# Altium footprint library 排针-排母-1.27.PcbLib: 152 footprints (part 6 of 10)
Each footprint in its own frame and in the unit in brackets; x right, y up, seen from the top. Pads: shape width x height; smd on the part's side, far side on the other; paste and mask are expansions set on the pad; w line width, h text height; cw(c..) or ccw(c..) is an arc to the next point about the centre after c.
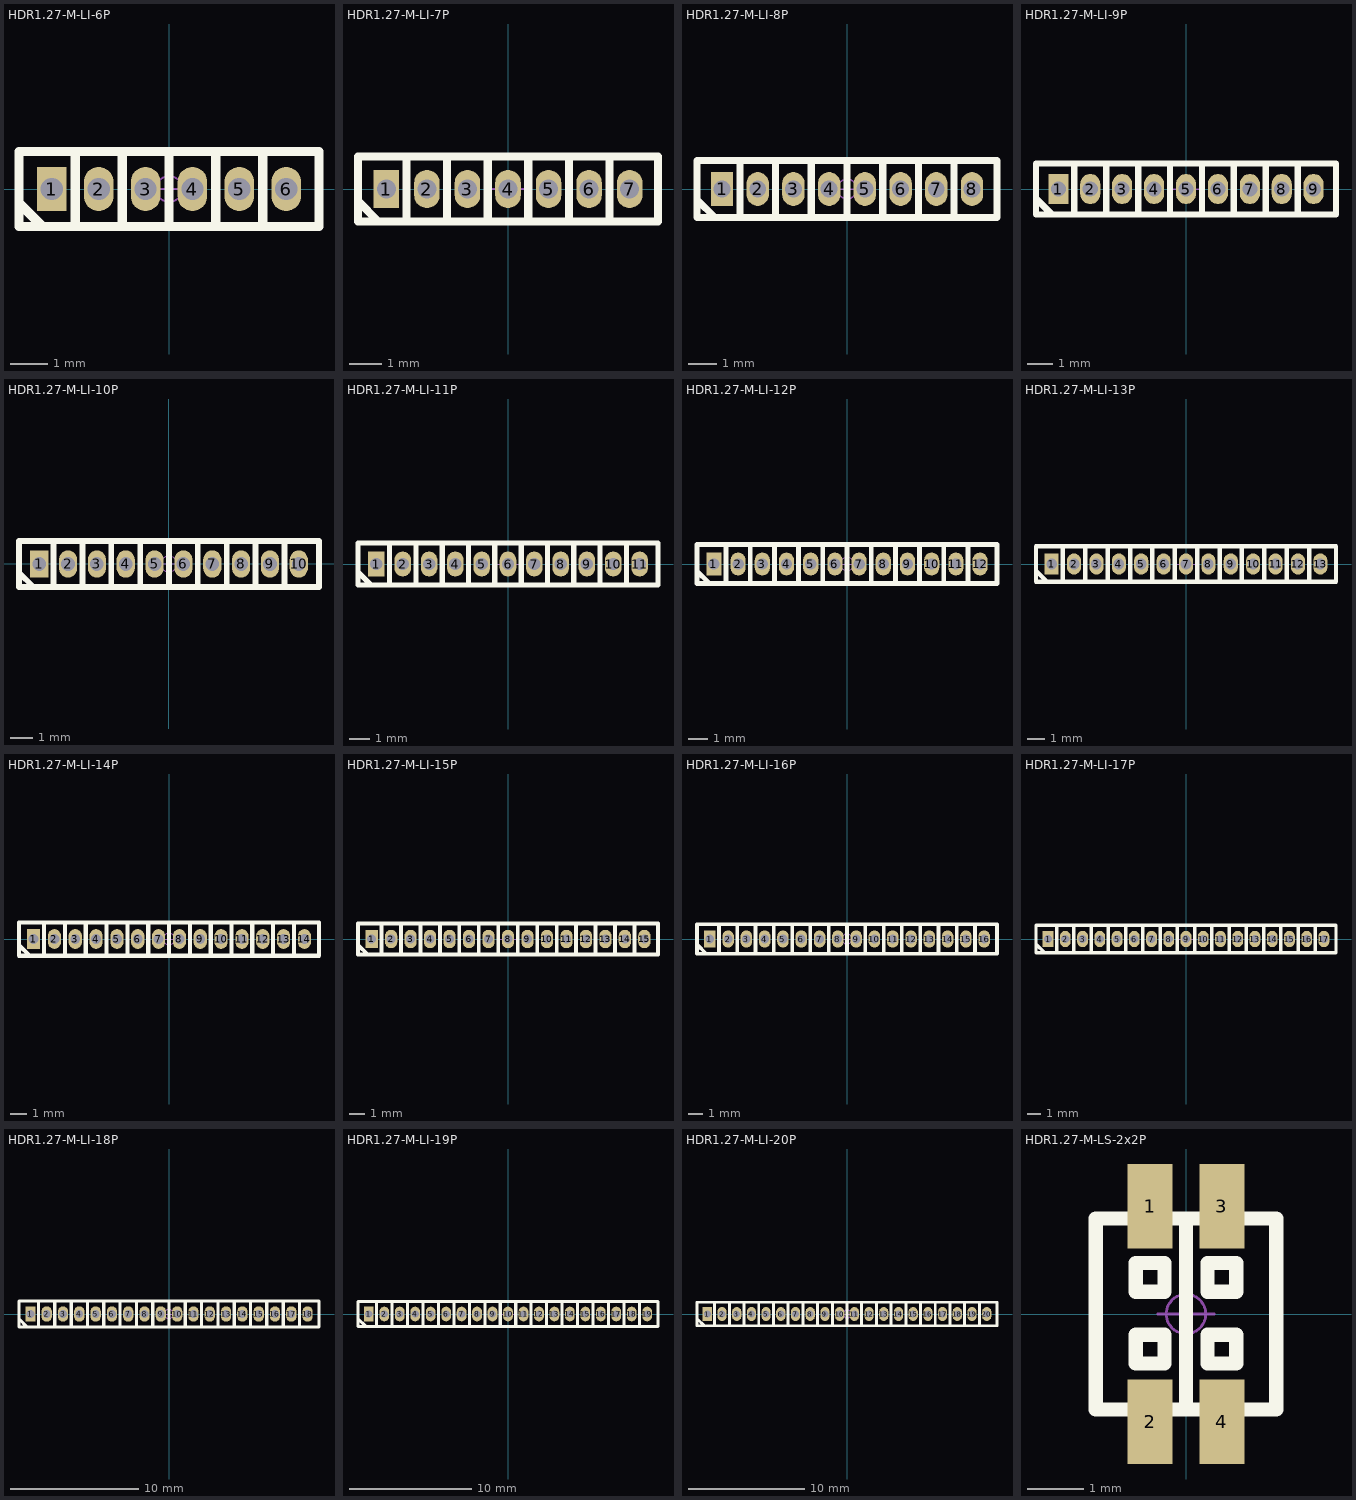
[diagram p5: the footprints below, top view; thin cyan lines are the x and y axes]

## HDR1.27-M-LI-6P [mm] "直插，脚距：1.27mm"
pads (6):
  rect 0.8x1.2 hole 0.6: 1(-3.175,0)
  oval 0.8x1.2 hole 0.6: 2(-1.905,0) 3(-0.635,0) 4(0.635,0) 5(1.905,0) 6(3.175,0)
Top Overlay:
  lines w0.254: -4.064,-0.254 -4.064,-0.381 -3.429,-1.016 ; -2.54,-1.016 -2.54,1.016 ; -1.27,-1.016 -1.27,1.016 ; 0,-1.016 0,1.016 ; 1.27,-1.016 1.27,1.016 ; 2.54,-1.016 2.54,1.016 ; -4.064,-1.016 4.064,-1.016 4.064,1.016 -4.064,1.016 -4.064,-1.016
Mechanical 15:
  circle w0.05: c0,0 r0.35
  lines w0.05: -0.5,0 0.5,0 ; 0,-0.5 0,0.5
3D body: height 4.5, standoff -2.1, extent -3.975,-0.9 3.975,0.9

## HDR1.27-M-LI-7P [mm] "直插，脚距：1.27mm"
pads (7):
  rect 0.8x1.2 hole 0.6: 1(-3.81,0)
  oval 0.8x1.2 hole 0.6: 2(-2.54,0) 3(-1.27,0) 4(0,0) 5(1.27,0) 6(2.54,0) 7(3.81,0)
Top Overlay:
  lines w0.254: -4.699,-0.254 -4.699,-0.381 -4.064,-1.016 ; -3.175,-1.016 -3.175,1.016 ; -1.905,-1.016 -1.905,1.016 ; -0.635,-1.016 -0.635,1.016 ; 0.635,-1.016 0.635,1.016 ; 1.905,-1.016 1.905,1.016 ; 3.175,-1.016 3.175,1.016 ; -4.699,-1.016 4.699,-1.016 4.699,1.016 -4.699,1.016 -4.699,-1.016
Mechanical 15:
  circle w0.05: c0,0 r0.35
  lines w0.05: -0.5,0 0.5,0 ; 0,-0.5 0,0.5
3D body: height 4.5, standoff -2.1, extent -4.61,-0.9 4.61,0.9

## HDR1.27-M-LI-8P [mm] "直插，脚距：1.27mm"
pads (8):
  rect 0.8x1.2 hole 0.6: 1(-4.445,0)
  oval 0.8x1.2 hole 0.6: 2(-3.175,0) 3(-1.905,0) 4(-0.635,0) 5(0.635,0) 6(1.905,0) 7(3.175,0) 8(4.445,0)
Top Overlay:
  lines w0.254: -5.334,-0.254 -5.334,-0.381 -4.699,-1.016 ; -3.81,-1.016 -3.81,1.016 ; -2.54,-1.016 -2.54,1.016 ; -1.27,-1.016 -1.27,1.016 ; 0,-1.016 0,1.016 ; 1.27,-1.016 1.27,1.016 ; 2.54,-1.016 2.54,1.016 ; 3.81,-1.016 3.81,1.016 ; -5.334,-1.016 -5.334,1.016 5.334,1.016 5.334,-1.016 -5.334,-1.016
Mechanical 15:
  circle w0.05: c0,0 r0.35
  lines w0.05: -0.5,0 0.5,0 ; 0,-0.5 0,0.5
3D body: height 4.5, standoff -2.1, extent -5.245,-0.9 5.245,0.9

## HDR1.27-M-LI-9P [mm] "直插，脚距：1.27mm"
pads (9):
  rect 0.8x1.2 hole 0.6: 1(-5.08,0)
  oval 0.8x1.2 hole 0.6: 2(-3.81,0) 3(-2.54,0) 4(-1.27,0) 5(0,0) 6(1.27,0) 7(2.54,0) 8(3.81,0) 9(5.08,0)
Top Overlay:
  lines w0.254: -5.969,-0.254 -5.969,-0.381 -5.334,-1.016 ; -4.445,-1.016 -4.445,1.016 ; -3.175,-1.016 -3.175,1.016 ; -1.905,-1.016 -1.905,1.016 ; -0.635,-1.016 -0.635,1.016 ; 0.635,-1.016 0.635,1.016 ; 1.905,-1.016 1.905,1.016 ; 3.175,-1.016 3.175,1.016 ; 4.445,-1.016 4.445,1.016 ; -5.969,-1.016 5.969,-1.016 5.969,1.016 -5.969,1.016 -5.969,-1.016
Mechanical 15:
  circle w0.05: c0,0 r0.35
  lines w0.05: -0.5,0 0.5,0 ; 0,-0.5 0,0.5
3D body: height 4.5, standoff -2.1, extent -5.88,-0.9 5.88,0.9

## HDR1.27-M-LI-10P [mm] "直插，脚距：1.27mm"
pads (10):
  rect 0.8x1.2 hole 0.6: 1(-5.715,0)
  oval 0.8x1.2 hole 0.6: 2(-4.445,0) 3(-3.175,0) 4(-1.905,0) 5(-0.635,0) 6(0.635,0) 7(1.905,0) 8(3.175,0) 9(4.445,0) 10(5.715,0)
Top Overlay:
  lines w0.254: -6.604,-0.254 -6.604,-0.381 -5.969,-1.016 ; -5.08,-1.016 -5.08,1.016 ; -3.81,-1.016 -3.81,1.016 ; -2.54,-1.016 -2.54,1.016 ; -1.27,-1.016 -1.27,1.016 ; 0,-1.016 0,1.016 ; 1.27,-1.016 1.27,1.016 ; 2.54,-1.016 2.54,1.016 ; 3.81,-1.016 3.81,1.016 ; 5.08,-1.016 5.08,1.016 ; -6.604,-1.016 -6.604,1.016 6.604,1.016 6.604,-1.016 -6.604,-1.016
Mechanical 15:
  circle w0.05: c0,0 r0.35
  lines w0.05: -0.5,0 0.5,0 ; 0,-0.5 0,0.5
3D body: height 4.5, standoff -2.1, extent -6.515,-0.9 6.515,0.9

## HDR1.27-M-LI-11P [mm] "直插，脚距：1.27mm"
pads (11):
  rect 0.8x1.2 hole 0.6: 1(-6.35,0)
  oval 0.8x1.2 hole 0.6: 2(-5.08,0) 3(-3.81,0) 4(-2.54,0) 5(-1.27,0) 6(0,0) 7(1.27,0) 8(2.54,0) 9(3.81,0) 10(5.08,0) 11(6.35,0)
Top Overlay:
  lines w0.254: -7.239,-0.254 -7.239,-0.381 -6.604,-1.016 ; -5.715,-1.016 -5.715,1.016 ; -4.445,-1.016 -4.445,1.016 ; -3.175,-1.016 -3.175,1.016 ; -1.905,-1.016 -1.905,1.016 ; -0.635,-1.016 -0.635,1.016 ; 0.635,-1.016 0.635,1.016 ; 1.905,-1.016 1.905,1.016 ; 3.175,-1.016 3.175,1.016 ; 4.445,-1.016 4.445,1.016 ; 5.715,-1.016 5.715,1.016 ; -7.239,-1.016 7.239,-1.016 7.239,1.016 -7.239,1.016 -7.239,-1.016
Mechanical 15:
  circle w0.05: c0,0 r0.35
  lines w0.05: -0.5,0 0.5,0 ; 0,-0.5 0,0.5
3D body: height 4.5, standoff -2.1, extent -7.15,-0.9 7.15,0.9

## HDR1.27-M-LI-12P [mm] "直插，脚距：1.27mm"
pads (12):
  rect 0.8x1.2 hole 0.6: 1(-6.985,0)
  oval 0.8x1.2 hole 0.6: 2(-5.715,0) 3(-4.445,0) 4(-3.175,0) 5(-1.905,0) 6(-0.635,0) 7(0.635,0) 8(1.905,0) 9(3.175,0) 10(4.445,0) 11(5.715,0) 12(6.985,0)
Top Overlay:
  lines w0.254: -7.874,-0.254 -7.874,-0.381 -7.239,-1.016 ; -6.35,-1.016 -6.35,1.016 ; -5.08,-1.016 -5.08,1.016 ; -3.81,-1.016 -3.81,1.016 ; -2.54,-1.016 -2.54,1.016 ; -1.27,-1.016 -1.27,1.016 ; 0,-1.016 0,1.016 ; 1.27,-1.016 1.27,1.016 ; 2.54,-1.016 2.54,1.016 ; 3.81,-1.016 3.81,1.016 ; 5.08,-1.016 5.08,1.016 ; 6.35,-1.016 6.35,1.016 ; -7.874,-1.016 7.874,-1.016 7.874,1.016 -7.874,1.016 -7.874,-1.016
Mechanical 15:
  circle w0.05: c0,0 r0.35
  lines w0.05: -0.5,0 0.5,0 ; 0,-0.5 0,0.5
3D body: height 4.5, standoff -2.1, extent -7.785,-0.9 7.785,0.9

## HDR1.27-M-LI-13P [mm] "直插，脚距：1.27mm"
pads (13):
  rect 0.8x1.2 hole 0.6: 1(-7.62,0)
  oval 0.8x1.2 hole 0.6: 2(-6.35,0) 3(-5.08,0) 4(-3.81,0) 5(-2.54,0) 6(-1.27,0) 7(0,0) 8(1.27,0) 9(2.54,0) 10(3.81,0) 11(5.08,0) 12(6.35,0) 13(7.62,0)
Top Overlay:
  lines w0.254: -8.509,-0.254 -8.509,-0.381 -7.874,-1.016 ; -6.985,-1.016 -6.985,1.016 ; -5.715,-1.016 -5.715,1.016 ; -4.445,-1.016 -4.445,1.016 ; -3.175,-1.016 -3.175,1.016 ; -1.905,-1.016 -1.905,1.016 ; -0.635,-1.016 -0.635,1.016 ; 0.635,-1.016 0.635,1.016 ; 1.905,-1.016 1.905,1.016 ; 3.175,-1.016 3.175,1.016 ; 4.445,-1.016 4.445,1.016 ; 5.715,-1.016 5.715,1.016 ; 6.985,-1.016 6.985,1.016 ; -8.509,-1.016 8.509,-1.016 8.509,1.016 -8.509,1.016 -8.509,-1.016
Mechanical 15:
  circle w0.05: c0,0 r0.35
  lines w0.05: -0.5,0 0.5,0 ; 0,-0.5 0,0.5
3D body: height 4.5, standoff -2.1, extent -8.42,-0.9 8.42,0.9

## HDR1.27-M-LI-14P [mm] "直插，脚距：1.27mm"
pads (14):
  rect 0.8x1.2 hole 0.6: 1(-8.255,0)
  oval 0.8x1.2 hole 0.6: 2(-6.985,0) 3(-5.715,0) 4(-4.445,0) 5(-3.175,0) 6(-1.905,0) 7(-0.635,0) 8(0.635,0) 9(1.905,0) 10(3.175,0) 11(4.445,0) 12(5.715,0) 13(6.985,0) 14(8.255,0)
Top Overlay:
  lines w0.254: -9.144,-0.254 -9.144,-0.381 -8.509,-1.016 ; -7.62,-1.016 -7.62,1.016 ; -6.35,-1.016 -6.35,1.016 ; -5.08,-1.016 -5.08,1.016 ; -3.81,-1.016 -3.81,1.016 ; -2.54,-1.016 -2.54,1.016 ; -1.27,-1.016 -1.27,1.016 ; 0,-1.016 0,1.016 ; 1.27,-1.016 1.27,1.016 ; 2.54,-1.016 2.54,1.016 ; 3.81,-1.016 3.81,1.016 ; 5.08,-1.016 5.08,1.016 ; 6.35,-1.016 6.35,1.016 ; 7.62,-1.016 7.62,1.016 ; -9.144,-1.016 -9.144,1.016 9.144,1.016 9.144,-1.016 -9.144,-1.016
Mechanical 15:
  circle w0.05: c0,0 r0.35
  lines w0.05: -0.5,0 0.5,0 ; 0,-0.5 0,0.5
3D body: height 4.5, standoff -2.1, extent -9.055,-0.9 9.055,0.9

## HDR1.27-M-LI-15P [mm] "直插，脚距：1.27mm"
pads (15):
  rect 0.8x1.2 hole 0.6: 1(-8.89,0)
  oval 0.8x1.2 hole 0.6: 2(-7.62,0) 3(-6.35,0) 4(-5.08,0) 5(-3.81,0) 6(-2.54,0) 7(-1.27,0) 8(0,0) 9(1.27,0) 10(2.54,0) 11(3.81,0) 12(5.08,0) 13(6.35,0) 14(7.62,0) 15(8.89,0)
Top Overlay:
  lines w0.254: -9.779,-0.254 -9.779,-0.381 -9.144,-1.016 ; -8.255,-1.016 -8.255,1.016 ; -6.985,-1.016 -6.985,1.016 ; -5.715,-1.016 -5.715,1.016 ; -4.445,-1.016 -4.445,1.016 ; -3.175,-1.016 -3.175,1.016 ; -1.905,-1.016 -1.905,1.016 ; -0.635,-1.016 -0.635,1.016 ; 0.635,-1.016 0.635,1.016 ; 1.905,-1.016 1.905,1.016 ; 3.175,-1.016 3.175,1.016 ; 4.445,-1.016 4.445,1.016 ; 5.715,-1.016 5.715,1.016 ; 6.985,-1.016 6.985,1.016 ; 8.255,-1.016 8.255,1.016 ; -9.779,-1.016 -9.779,1.016 9.779,1.016 9.779,-1.016 -9.779,-1.016
Mechanical 15:
  circle w0.05: c0,0 r0.35
  lines w0.05: -0.5,0 0.5,0 ; 0,-0.5 0,0.5
3D body: height 4.5, standoff -2.1, extent -9.69,-0.9 9.69,0.9

## HDR1.27-M-LI-16P [mm] "直插，脚距：1.27mm"
pads (16):
  rect 0.8x1.2 hole 0.6: 1(-9.525,0)
  oval 0.8x1.2 hole 0.6: 2(-8.255,0) 3(-6.985,0) 4(-5.715,0) 5(-4.445,0) 6(-3.175,0) 7(-1.905,0) 8(-0.635,0) 9(0.635,0) 10(1.905,0) 11(3.175,0) 12(4.445,0) 13(5.715,0) 14(6.985,0) 15(8.255,0) 16(9.525,0)
Top Overlay:
  lines w0.254: -10.414,-0.254 -10.414,-0.381 -9.779,-1.016 ; -8.89,-1.016 -8.89,1.016 ; -7.62,-1.016 -7.62,1.016 ; -6.35,-1.016 -6.35,1.016 ; -5.08,-1.016 -5.08,1.016 ; -3.81,-1.016 -3.81,1.016 ; -2.54,-1.016 -2.54,1.016 ; -1.27,-1.016 -1.27,1.016 ; 0,-1.016 0,1.016 ; 1.27,-1.016 1.27,1.016 ; 2.54,-1.016 2.54,1.016 ; 3.81,-1.016 3.81,1.016 ; 5.08,-1.016 5.08,1.016 ; 6.35,-1.016 6.35,1.016 ; 7.62,-1.016 7.62,1.016 ; 8.89,-1.016 8.89,1.016 ; -10.414,-1.016 -10.414,1.016 10.414,1.016 10.414,-1.016 -10.414,-1.016
Mechanical 15:
  circle w0.05: c0,0 r0.35
  lines w0.05: -0.5,0 0.5,0 ; 0,-0.5 0,0.5
3D body: height 4.5, standoff -2.1, extent -10.325,-0.9 10.325,0.9

## HDR1.27-M-LI-17P [mm] "直插，脚距：1.27mm"
pads (17):
  rect 0.8x1.2 hole 0.6: 1(-10.16,0)
  oval 0.8x1.2 hole 0.6: 2(-8.89,0) 3(-7.62,0) 4(-6.35,0) 5(-5.08,0) 6(-3.81,0) 7(-2.54,0) 8(-1.27,0) 9(0,0) 10(1.27,0) 11(2.54,0) 12(3.81,0) 13(5.08,0) 14(6.35,0) 15(7.62,0) 16(8.89,0) 17(10.16,0)
Top Overlay:
  lines w0.254: -11.049,-0.254 -11.049,-0.381 -10.414,-1.016 ; -9.525,-1.016 -9.525,1.016 ; -8.255,-1.016 -8.255,1.016 ; -6.985,-1.016 -6.985,1.016 ; -5.715,-1.016 -5.715,1.016 ; -4.445,-1.016 -4.445,1.016 ; -3.175,-1.016 -3.175,1.016 ; -1.905,-1.016 -1.905,1.016 ; -0.635,-1.016 -0.635,1.016 ; 0.635,-1.016 0.635,1.016 ; 1.905,-1.016 1.905,1.016 ; 3.175,-1.016 3.175,1.016 ; 4.445,-1.016 4.445,1.016 ; 5.715,-1.016 5.715,1.016 ; 6.985,-1.016 6.985,1.016 ; 8.255,-1.016 8.255,1.016 ; 9.525,-1.016 9.525,1.016 ; -11.049,-1.016 11.049,-1.016 11.049,1.016 -11.049,1.016 -11.049,-1.016
Mechanical 15:
  circle w0.05: c0,0 r0.35
  lines w0.05: -0.5,0 0.5,0 ; 0,-0.5 0,0.5
3D body: height 4.5, standoff -2.1, extent -10.96,-0.9 10.96,0.9

## HDR1.27-M-LI-18P [mm] "直插，脚距：1.27mm"
pads (18):
  rect 0.8x1.2 hole 0.6: 1(-10.795,0)
  oval 0.8x1.2 hole 0.6: 2(-9.525,0) 3(-8.255,0) 4(-6.985,0) 5(-5.715,0) 6(-4.445,0) 7(-3.175,0) 8(-1.905,0) 9(-0.635,0) 10(0.635,0) 11(1.905,0) 12(3.175,0) 13(4.445,0) 14(5.715,0) 15(6.985,0) 16(8.255,0) 17(9.525,0) 18(10.795,0)
Top Overlay:
  lines w0.254: -11.684,-0.254 -11.684,-0.381 -11.049,-1.016 ; -10.16,-1.016 -10.16,1.016 ; -8.89,-1.016 -8.89,1.016 ; -7.62,-1.016 -7.62,1.016 ; -6.35,-1.016 -6.35,1.016 ; -5.08,-1.016 -5.08,1.016 ; -3.81,-1.016 -3.81,1.016 ; -2.54,-1.016 -2.54,1.016 ; -1.27,-1.016 -1.27,1.016 ; 0,-1.016 0,1.016 ; 1.27,-1.016 1.27,1.016 ; 2.54,-1.016 2.54,1.016 ; 3.81,-1.016 3.81,1.016 ; 5.08,-1.016 5.08,1.016 ; 6.35,-1.016 6.35,1.016 ; 7.62,-1.016 7.62,1.016 ; 8.89,-1.016 8.89,1.016 ; 10.16,-1.016 10.16,1.016 ; -11.684,-1.016 -11.684,1.016 11.684,1.016 11.684,-1.016 -11.684,-1.016
Mechanical 15:
  circle w0.05: c0,0 r0.35
  lines w0.05: -0.5,0 0.5,0 ; 0,-0.5 0,0.5
3D body: height 4.5, standoff -2.1, extent -11.595,-0.9 11.595,0.9

## HDR1.27-M-LI-19P [mm] "直插，脚距：1.27mm"
pads (19):
  rect 0.8x1.2 hole 0.6: 1(-11.43,0)
  oval 0.8x1.2 hole 0.6: 2(-10.16,0) 3(-8.89,0) 4(-7.62,0) 5(-6.35,0) 6(-5.08,0) 7(-3.81,0) 8(-2.54,0) 9(-1.27,0) 10(0,0) 11(1.27,0) 12(2.54,0) 13(3.81,0) 14(5.08,0) 15(6.35,0) 16(7.62,0) 17(8.89,0) 18(10.16,0) 19(11.43,0)
Top Overlay:
  lines w0.254: -12.319,-0.254 -12.319,-0.381 -11.684,-1.016 ; -10.795,-1.016 -10.795,1.016 ; -9.525,-1.016 -9.525,1.016 ; -8.255,-1.016 -8.255,1.016 ; -6.985,-1.016 -6.985,1.016 ; -5.715,-1.016 -5.715,1.016 ; -4.445,-1.016 -4.445,1.016 ; -3.175,-1.016 -3.175,1.016 ; -1.905,-1.016 -1.905,1.016 ; -0.635,-1.016 -0.635,1.016 ; 0.635,-1.016 0.635,1.016 ; 1.905,-1.016 1.905,1.016 ; 3.175,-1.016 3.175,1.016 ; 4.445,-1.016 4.445,1.016 ; 5.715,-1.016 5.715,1.016 ; 6.985,-1.016 6.985,1.016 ; 8.255,-1.016 8.255,1.016 ; 9.525,-1.016 9.525,1.016 ; 10.795,-1.016 10.795,1.016 ; -12.319,-1.016 -12.319,1.016 12.319,1.016 12.319,-1.016 -12.319,-1.016
Mechanical 15:
  circle w0.05: c0,0 r0.35
  lines w0.05: -0.5,0 0.5,0 ; 0,-0.5 0,0.5
3D body: height 4.5, standoff -2.1, extent -12.23,-0.9 12.23,0.9

## HDR1.27-M-LI-20P [mm] "直插，脚距：1.27mm"
pads (20):
  rect 0.8x1.2 hole 0.6: 1(-12.065,0)
  oval 0.8x1.2 hole 0.6: 2(-10.795,0) 3(-9.525,0) 4(-8.255,0) 5(-6.985,0) 6(-5.715,0) 7(-4.445,0) 8(-3.175,0) 9(-1.905,0) 10(-0.635,0) 11(0.635,0) 12(1.905,0) 13(3.175,0) 14(4.445,0) 15(5.715,0) 16(6.985,0) 17(8.255,0) 18(9.525,0) 19(10.795,0) 20(12.065,0)
Top Overlay:
  lines w0.254: -12.954,-0.254 -12.954,-0.381 -12.319,-1.016 ; -11.43,-1.016 -11.43,1.016 ; -10.16,-1.016 -10.16,1.016 ; -8.89,-1.016 -8.89,1.016 ; -7.62,-1.016 -7.62,1.016 ; -6.35,-1.016 -6.35,1.016 ; -5.08,-1.016 -5.08,1.016 ; -3.81,-1.016 -3.81,1.016 ; -2.54,-1.016 -2.54,1.016 ; -1.27,-1.016 -1.27,1.016 ; 0,-1.016 0,1.016 ; 1.27,-1.016 1.27,1.016 ; 2.54,-1.016 2.54,1.016 ; 3.81,-1.016 3.81,1.016 ; 5.08,-1.016 5.08,1.016 ; 6.35,-1.016 6.35,1.016 ; 7.62,-1.016 7.62,1.016 ; 8.89,-1.016 8.89,1.016 ; 10.16,-1.016 10.16,1.016 ; 11.43,-1.016 11.43,1.016 ; -12.954,-1.016 -12.954,1.016 12.954,1.016 12.954,-1.016 -12.954,-1.016
Mechanical 15:
  circle w0.05: c0,0 r0.35
  lines w0.05: -0.5,0 0.5,0 ; 0,-0.5 0,0.5
3D body: height 4.5, standoff -2.1, extent -12.865,-0.9 12.865,0.9

## HDR1.27-M-LS-2x2P [mm] "双排贴片排母，脚距：1.27mm"
pads (4):
  rect 0.8x1.5 smd: 1(-0.635,1.905) 2(-0.635,-1.905) 3(0.635,1.905) 4(0.635,-1.905)
Top Overlay:
  lines w0.254: 0,-1.689 0,1.689 ; -1.6,-1.689 1.6,-1.689 1.6,1.689 -1.6,1.689 -1.6,-1.689 ; -0.889,-0.876 -0.889,-0.368 -0.381,-0.368 -0.381,-0.876 -0.889,-0.876 ; -0.889,0.394 -0.381,0.394 -0.381,0.902 -0.889,0.902 -0.889,0.394 ; 0.381,-0.876 0.889,-0.876 0.889,-0.368 0.381,-0.368 0.381,-0.876 ; 0.381,0.394 0.381,0.902 0.889,0.902 0.889,0.394 0.381,0.394
Mechanical 15:
  circle w0.05: c0,0 r0.35
  lines w0.05: -0.5,0 0.5,0 ; 0,-0.5 0,0.5
3D body: height 4.67, standoff 0, extent -1.47,-2.4 0,2.4
3D body: height 4.67, standoff 0, extent 0,-2.4 1.47,2.4